# Altium footprint library PcbLib1.PcbLib: 49 footprints (part 1 of 4)
Each footprint in its own frame and in the unit in brackets; x right, y up, seen from the top. Pads: shape width x height; smd on the part's side, far side on the other; paste and mask are expansions set on the pad; w line width, h text height; cw(c..) or ccw(c..) is an arc to the next point about the centre after c.
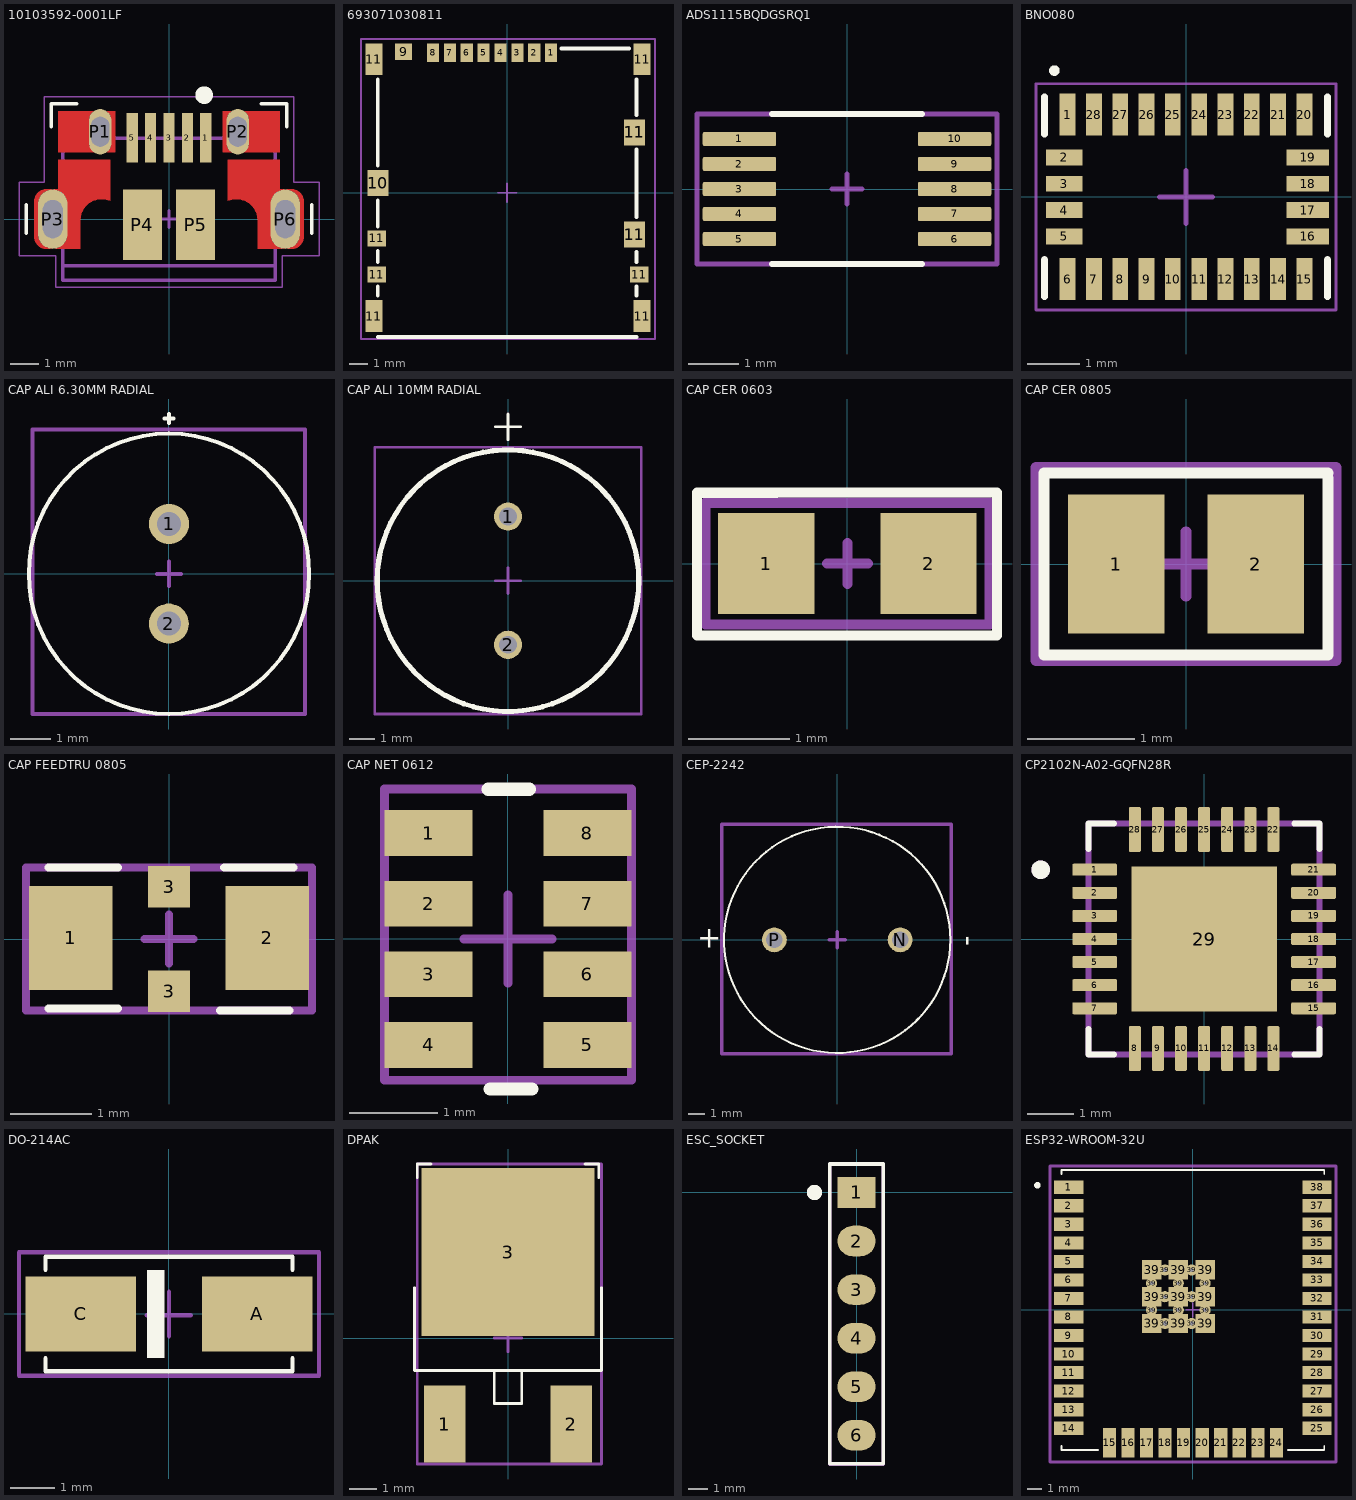
[diagram p0: the footprints below, top view; thin cyan lines are the x and y axes]

## 10103592-0001LF [mm]
pads (11):
  rect 0.4x1.75 smd mask+0.07: 1(1.3,2.875) 2(0.65,2.875) 3(0,2.875) 4(-0.65,2.875) 5(-1.3,2.875)
  oval 0.8x1.6 hole 0.65 slot 1.05 at 90 deg: P1(-2.425,3.08) P2(2.425,3.08)
  oval 1.05x2.1 hole 0.7 slot 1.34 at 90 deg: P3(-4.1,0) P6(4.1,0)
  rect 1.375x2.5 smd mask+0.07: P4(-0.937,-0.2) P5(0.937,-0.2)
Top Layer:
  region: -4.13,1.045 -4.16,1.043 -4.185,1.04 -4.21,1.035 -4.235,1.03 -4.259,1.023 -4.283,1.015 -4.307,1.005 -4.33,0.995 -4.352,0.983 -4.374,0.971 -4.396,0.957 -4.416,0.942 -4.436,0.926 -4.455,0.91 -4.473,0.892 -4.491,0.874 -4.507,0.854 -4.523,0.834 -4.537,0.813 -4.55,0.792 -4.563,0.769 -4.574,0.747 -4.584,0.723 -4.593,0.7 -4.6,0.675 -4.607,0.651 -4.612,0.626 -4.616,0.601 -4.619,0.576 -4.62,0.555 -4.62,-0.525 -4.619,-0.555 -4.617,-0.582 -4.614,-0.608 -4.609,-0.635 -4.602,-0.661 -4.595,-0.687 -4.586,-0.713 -4.575,-0.738 -4.564,-0.762 -4.551,-0.786 -4.537,-0.809 -4.521,-0.832 -4.505,-0.853 -4.487,-0.874 -4.468,-0.893 -4.449,-0.912 -4.428,-0.93 -4.407,-0.946 -4.384,-0.962 -4.361,-0.976 -4.337,-0.989 -4.313,-1 -4.288,-1.011 -4.262,-1.02 -4.236,-1.027 -4.21,-1.034 -4.183,-1.039 -4.157,-1.042 -4.13,-1.044 -4.105,-1.045 -4.105,-1.05 -4.33,-1.05 -4.352,-1.049 -4.374,-1.048 -4.396,-1.045 -4.417,-1.041 -4.439,-1.036 -4.46,-1.029 -4.481,-1.022 -4.501,-1.014 -4.521,-1.004 -4.54,-0.994 -4.559,-0.982 -4.577,-0.97 -4.594,-0.956 -4.611,-0.942 -4.627,-0.927 -4.642,-0.911 -4.656,-0.894 -4.67,-0.877 -4.682,-0.859 -4.694,-0.84 -4.704,-0.821 -4.714,-0.801 -4.722,-0.781 -4.729,-0.76 -4.736,-0.739 -4.741,-0.717 -4.745,-0.696 -4.748,-0.674 -4.749,-0.652 -4.75,-0.63 -4.75,0.63 -4.749,0.652 -4.748,0.674 -4.745,0.696 -4.741,0.717 -4.736,0.739 -4.729,0.76 -4.722,0.781 -4.714,0.801 -4.704,0.821 -4.694,0.84 -4.682,0.859 -4.67,0.877 -4.656,0.894 -4.642,0.911 -4.627,0.927 -4.611,0.942 -4.594,0.956 -4.577,0.97 -4.559,0.982 -4.54,0.994 -4.521,1.004 -4.501,1.014 -4.481,1.022 -4.46,1.029 -4.439,1.036 -4.417,1.041 -4.396,1.045 -4.374,1.048 -4.352,1.049 -4.33,1.05 -4.13,1.05
  region: -2.075,0.64 -2.115,0.656 -2.161,0.671 -2.207,0.684 -2.254,0.693 -2.302,0.699 -2.35,0.703 -2.398,0.703 -2.446,0.7 -2.493,0.694 -2.541,0.685 -2.587,0.673 -2.633,0.658 -2.677,0.64 -2.721,0.619 -2.763,0.596 -2.803,0.57 -2.841,0.541 -2.878,0.51 -2.913,0.477 -2.945,0.442 -2.975,0.404 -3.003,0.365 -3.028,0.324 -3.051,0.281 -3.07,0.238 -3.087,0.193 -3.101,0.147 -3.112,0.1 -3.12,0.053 -3.125,0 -3.125,-1.05 -4.06,-1.05 -4.06,-1.045 -4.03,-1.042 -4.005,-1.038 -3.979,-1.032 -3.954,-1.026 -3.93,-1.018 -3.906,-1.009 -3.882,-0.998 -3.859,-0.987 -3.837,-0.975 -3.815,-0.961 -3.794,-0.946 -3.773,-0.931 -3.754,-0.914 -3.735,-0.896 -3.717,-0.878 -3.7,-0.858 -3.684,-0.838 -3.669,-0.817 -3.655,-0.795 -3.642,-0.773 -3.631,-0.75 -3.62,-0.726 -3.611,-0.702 -3.603,-0.678 -3.596,-0.653 -3.59,-0.628 -3.586,-0.603 -3.583,-0.577 -3.581,-0.551 -3.58,-0.53 -3.585,0.555 -3.586,0.576 -3.589,0.601 -3.593,0.626 -3.598,0.651 -3.605,0.675 -3.612,0.7 -3.621,0.723 -3.631,0.747 -3.642,0.769 -3.655,0.792 -3.668,0.813 -3.682,0.834 -3.698,0.854 -3.714,0.874 -3.732,0.892 -3.75,0.91 -3.769,0.926 -3.789,0.942 -3.809,0.957 -3.831,0.971 -3.853,0.983 -3.875,0.995 -3.898,1.005 -3.922,1.015 -3.946,1.023 -3.97,1.03 -3.995,1.035 -4.02,1.04 -4.045,1.043 -4.075,1.045 -4.075,1.05 -3.9,1.05 -3.9,2.1 -2.075,2.1
  region: 4.352,1.049 4.374,1.048 4.396,1.045 4.417,1.041 4.439,1.036 4.46,1.029 4.481,1.022 4.501,1.014 4.521,1.004 4.54,0.994 4.559,0.982 4.577,0.97 4.594,0.956 4.611,0.942 4.627,0.927 4.642,0.911 4.656,0.894 4.67,0.877 4.682,0.859 4.694,0.84 4.704,0.821 4.714,0.801 4.722,0.781 4.729,0.76 4.736,0.739 4.741,0.717 4.745,0.696 4.748,0.674 4.749,0.652 4.75,0.63 4.75,-0.63 4.749,-0.652 4.748,-0.674 4.745,-0.696 4.741,-0.717 4.736,-0.739 4.729,-0.76 4.722,-0.781 4.714,-0.801 4.704,-0.821 4.694,-0.84 4.682,-0.859 4.67,-0.877 4.656,-0.894 4.642,-0.911 4.627,-0.927 4.611,-0.942 4.594,-0.956 4.577,-0.97 4.559,-0.982 4.54,-0.994 4.521,-1.004 4.501,-1.014 4.481,-1.022 4.46,-1.029 4.439,-1.036 4.417,-1.041 4.396,-1.045 4.374,-1.048 4.352,-1.049 4.33,-1.05 4.105,-1.05 4.105,-1.045 4.13,-1.044 4.157,-1.042 4.183,-1.039 4.21,-1.034 4.236,-1.027 4.262,-1.02 4.288,-1.011 4.313,-1 4.337,-0.989 4.361,-0.976 4.384,-0.962 4.407,-0.946 4.428,-0.93 4.449,-0.912 4.468,-0.893 4.487,-0.874 4.505,-0.853 4.521,-0.832 4.537,-0.809 4.551,-0.786 4.564,-0.762 4.575,-0.738 4.586,-0.713 4.595,-0.687 4.602,-0.661 4.609,-0.635 4.614,-0.608 4.617,-0.582 4.619,-0.555 4.62,-0.525 4.62,0.555 4.619,0.576 4.616,0.601 4.612,0.626 4.607,0.651 4.6,0.675 4.593,0.7 4.584,0.723 4.574,0.747 4.563,0.769 4.55,0.792 4.537,0.813 4.523,0.834 4.507,0.854 4.491,0.874 4.473,0.892 4.455,0.91 4.436,0.926 4.416,0.942 4.396,0.957 4.374,0.971 4.352,0.983 4.33,0.995 4.307,1.005 4.283,1.015 4.259,1.023 4.235,1.03 4.21,1.035 4.185,1.04 4.16,1.043 4.13,1.045 4.13,1.05 4.33,1.05
  region: 3.9,1.05 4.075,1.05 4.075,1.045 4.045,1.043 4.02,1.04 3.995,1.035 3.97,1.03 3.946,1.023 3.922,1.015 3.898,1.005 3.875,0.995 3.853,0.983 3.831,0.971 3.809,0.957 3.789,0.942 3.769,0.926 3.75,0.91 3.732,0.892 3.714,0.874 3.698,0.854 3.682,0.834 3.668,0.813 3.655,0.792 3.642,0.769 3.631,0.747 3.621,0.723 3.612,0.7 3.605,0.675 3.598,0.651 3.593,0.626 3.589,0.601 3.586,0.576 3.585,0.555 3.58,-0.53 3.581,-0.551 3.583,-0.577 3.586,-0.603 3.59,-0.628 3.596,-0.653 3.603,-0.678 3.611,-0.702 3.62,-0.726 3.631,-0.75 3.642,-0.773 3.655,-0.795 3.669,-0.817 3.684,-0.838 3.7,-0.858 3.717,-0.878 3.735,-0.896 3.754,-0.914 3.773,-0.931 3.794,-0.946 3.815,-0.961 3.837,-0.975 3.859,-0.987 3.882,-0.998 3.906,-1.009 3.93,-1.018 3.954,-1.026 3.979,-1.032 4.005,-1.038 4.03,-1.042 4.06,-1.045 4.06,-1.05 3.125,-1.05 3.125,0 3.12,0.053 3.112,0.1 3.101,0.147 3.087,0.193 3.07,0.238 3.051,0.281 3.028,0.324 3.003,0.365 2.975,0.404 2.945,0.442 2.913,0.477 2.878,0.51 2.841,0.541 2.803,0.57 2.763,0.596 2.721,0.619 2.677,0.64 2.633,0.658 2.587,0.673 2.541,0.685 2.493,0.694 2.446,0.7 2.398,0.703 2.35,0.703 2.302,0.699 2.254,0.693 2.207,0.684 2.161,0.671 2.115,0.656 2.075,0.64 2.075,2.1 3.9,2.1
  region: 2.2,3.79 2.191,3.785 2.183,3.78 2.175,3.775 2.168,3.77 2.16,3.765 2.153,3.76 2.146,3.754 2.139,3.748 2.132,3.742 2.126,3.736 2.119,3.729 2.113,3.722 2.107,3.716 2.101,3.709 2.096,3.701 2.09,3.694 2.085,3.687 2.08,3.679 2.076,3.671 2.071,3.663 2.067,3.655 2.063,3.647 2.059,3.639 2.056,3.63 2.052,3.622 2.049,3.613 2.046,3.605 2.044,3.596 2.042,3.587 2.04,3.58 2.03,2.61 2.032,2.597 2.035,2.587 2.037,2.576 2.04,2.566 2.044,2.555 2.047,2.545 2.051,2.535 2.055,2.525 2.06,2.515 2.064,2.505 2.069,2.495 2.075,2.486 2.08,2.477 2.086,2.467 2.092,2.458 2.099,2.45 2.105,2.441 2.112,2.433 2.119,2.424 2.127,2.416 2.134,2.408 2.142,2.401 2.15,2.394 2.158,2.386 2.167,2.38 2.175,2.373 2.184,2.367 2.193,2.36 2.202,2.355 2.21,2.35 1.9,2.35 1.9,3.81 2.2,3.81
  region: 3.9,2.35 2.61,2.35 2.619,2.354 2.628,2.359 2.637,2.364 2.647,2.37 2.656,2.376 2.665,2.382 2.673,2.388 2.682,2.395 2.69,2.401 2.698,2.408 2.706,2.416 2.714,2.423 2.722,2.431 2.729,2.439 2.736,2.447 2.743,2.455 2.749,2.464 2.755,2.472 2.761,2.481 2.767,2.49 2.773,2.5 2.778,2.509 2.783,2.519 2.788,2.528 2.792,2.538 2.796,2.548 2.8,2.558 2.804,2.568 2.807,2.578 2.81,2.59 2.82,3.55 2.819,3.559 2.817,3.57 2.814,3.58 2.812,3.591 2.809,3.601 2.806,3.611 2.802,3.621 2.799,3.631 2.795,3.641 2.79,3.651 2.786,3.661 2.781,3.67 2.776,3.68 2.77,3.689 2.764,3.698 2.758,3.707 2.752,3.715 2.746,3.724 2.739,3.732 2.732,3.74 2.725,3.748 2.718,3.756 2.71,3.764 2.702,3.771 2.694,3.778 2.686,3.785 2.677,3.791 2.669,3.798 2.66,3.804 2.65,3.81 3.9,3.81
  region: -1.9,2.35 -2.21,2.35 -2.202,2.355 -2.193,2.36 -2.184,2.367 -2.175,2.373 -2.167,2.38 -2.158,2.386 -2.15,2.394 -2.142,2.401 -2.134,2.408 -2.127,2.416 -2.119,2.424 -2.112,2.433 -2.105,2.441 -2.099,2.45 -2.092,2.458 -2.086,2.467 -2.08,2.477 -2.075,2.486 -2.069,2.495 -2.064,2.505 -2.06,2.515 -2.055,2.525 -2.051,2.535 -2.047,2.545 -2.044,2.555 -2.04,2.566 -2.037,2.576 -2.035,2.587 -2.032,2.597 -2.03,2.61 -2.04,3.58 -2.042,3.587 -2.044,3.596 -2.046,3.605 -2.049,3.613 -2.052,3.622 -2.056,3.63 -2.059,3.639 -2.063,3.647 -2.067,3.655 -2.071,3.663 -2.076,3.671 -2.08,3.679 -2.085,3.687 -2.09,3.694 -2.096,3.701 -2.101,3.709 -2.107,3.716 -2.113,3.722 -2.119,3.729 -2.126,3.736 -2.132,3.742 -2.139,3.748 -2.146,3.754 -2.153,3.76 -2.16,3.765 -2.168,3.77 -2.175,3.775 -2.183,3.78 -2.191,3.785 -2.2,3.79 -2.2,3.81 -1.9,3.81
  region: -2.66,3.804 -2.669,3.798 -2.677,3.791 -2.686,3.785 -2.694,3.778 -2.702,3.771 -2.71,3.764 -2.718,3.756 -2.725,3.748 -2.732,3.74 -2.739,3.732 -2.746,3.724 -2.752,3.715 -2.758,3.707 -2.764,3.698 -2.77,3.689 -2.776,3.68 -2.781,3.67 -2.786,3.661 -2.79,3.651 -2.795,3.641 -2.799,3.631 -2.802,3.621 -2.806,3.611 -2.809,3.601 -2.812,3.591 -2.814,3.58 -2.817,3.57 -2.819,3.559 -2.82,3.55 -2.81,2.59 -2.807,2.578 -2.804,2.568 -2.8,2.558 -2.796,2.548 -2.792,2.538 -2.788,2.528 -2.783,2.519 -2.778,2.509 -2.773,2.5 -2.767,2.49 -2.761,2.481 -2.755,2.472 -2.749,2.464 -2.743,2.455 -2.736,2.447 -2.729,2.439 -2.722,2.431 -2.714,2.423 -2.706,2.416 -2.698,2.408 -2.69,2.401 -2.682,2.395 -2.673,2.388 -2.665,2.382 -2.656,2.376 -2.647,2.37 -2.637,2.364 -2.628,2.359 -2.619,2.354 -2.61,2.35 -3.9,2.35 -3.9,3.81 -2.65,3.81
Top Overlay:
  circle w0.32: c1.24,4.372 r0.15
  lines w0.127: -5.04,-0.5 -5.04,0.5 ; -4.154,3.25 -4.154,4.064 -3.25,4.064 ; 3.25,4.064 4.154,4.064 4.154,3.25 ; 5.04,-0.5 5.04,0.5
Bottom 3D Body:
  lines w0.05: -5.29,-1.3 -5.29,1.3 -4.404,1.3 -4.404,4.314 4.404,4.314 4.404,1.3 5.29,1.3 5.29,-1.3 4,-1.3 4,-2.4 -4,-2.4 -4,-1.3 -5.29,-1.3
  lines w0.1: -0.3,0 0.3,0 ; 0,-0.3 0,0.3
Bottom Component Center:
  lines w0.127: -3.75,-1.65 3.75,-1.65 ; -3.75,-1.65 -3.75,2.85 3.75,2.85 3.75,-1.65 ; -3.75,-1.65 -3.75,-2.15 3.75,-2.15 3.75,-1.65
  text "'.Designator'" at -3.3,-0.5 h1
3D body "10103592-0001LF--3DModel-STEP-56544.STEP": height 2.78, standoff -0.76, extent -4.25,-2.7 4.25,3.31

## 693071030811 [mm]
pads (19):
  rect 0.65x1 smd: 1(2.35,7.47) 2(1.45,7.47) 3(0.55,7.47) 4(-0.35,7.47) 5(-1.25,7.47) 6(-2.15,7.47) 7(-3.05,7.47) 8(-3.95,7.47)
  rect 0.9x0.9 smd: 9(-5.52,7.52)
  rect 1.13x1.4 smd: 10(-6.89,0.52) 11(6.79,-2.23) 11(6.79,3.22)
  rect 0.9x1.7 smd: 11(-7.1,-6.58) 11(-7.1,7.12) 11(7.2,-6.58) 11(7.2,7.12)
  rect 1x0.85 smd: 11(-6.95,-4.36) 11(-6.95,-2.43) 11(7.05,-4.36)
Top Overlay:
  lines w0.2: -6.9,-7.7 6.9,-7.7 ; -6.9,-5.5 -6.9,-5 ; -6.9,-3.7 -6.9,-3.1 ; -6.9,-1.8 -6.9,-0.4 ; -6.9,1.45 -6.9,6.05 ; 2.9,7.7 6.5,7.7 ; 6.9,-5.5 6.9,-5 ; 6.9,-3.7 6.9,-3.15 ; 6.9,-1.3 6.9,2.3 ; 6.9,4.15 6.9,6.05
Bottom 3D Body:
  lines w0.1: -0.5,0 0,0 ; 0,-0.5 0,0 ; 0,0.5 0,0 ; 0.5,0 0,0 ; -7.8,-7.8 -7.8,8.2 7.9,8.2 7.9,-7.8 -7.8,-7.8
Bottom Component Center:
  lines w0.1: -7.8,-7.8 -7.8,8.2 7.9,8.2 7.9,-7.8 -7.8,-7.8
  text "'.Designator'" at -5.9,-1.9 h2
3D body "693071030811.stp": height 1.3, standoff 0, extent -7.36,-7.65 7.36,7.7

## ADS1115BQDGSRQ1 [mm]
pads (10):
  rrect25% 1.47x0.28 smd mask+0.05: 1(-2.15,1) 2(-2.15,0.5) 3(-2.15,0) 4(-2.15,-0.5) 5(-2.15,-1) 6(2.15,-1) 7(2.15,-0.5) 8(2.15,0) 9(2.15,0.5) 10(2.15,1)
Top Overlay:
  lines w0.127: -1.5,-1.5 1.5,-1.5 ; -1.5,1.5 1.5,1.5
Bottom 3D Body:
  lines w0.1: -0.3,0 0.3,0 ; 0,-0.3 0,0.3 ; -3,-1.5 -3,1.5 3,1.5 3,-1.5 -3,-1.5
Bottom Component Center:
  lines w0.1: -3,-1.5 -3,1.5 3,1.5 3,-1.5 -3,-1.5
  text "'.Designator'" at -2.8,-0.7 h0.7
3D body "step_temp.STEP": height 1.1, standoff 0, extent -2.45,-1.5 2.45,1.5

## BNO080 [mm]
pads (28):
  rect 0.3x0.8 smd mask+0.05: 1(-2.25,1.562) 6(-2.25,-1.562) 7(-1.75,-1.562) 8(-1.25,-1.562) 9(-0.75,-1.562) 10(-0.25,-1.562) 11(0.25,-1.562) 12(0.75,-1.562) 13(1.25,-1.562) 14(1.75,-1.562) 15(2.25,-1.562) 20(2.25,1.562) 21(1.75,1.562) 22(1.25,1.562) 23(0.75,1.562) 24(0.25,1.562) 25(-0.25,1.562) 26(-0.75,1.562) 27(-1.25,1.562) 28(-1.75,1.562)
  rect 0.7x0.3 smd mask+0.05: 2(-2.312,0.75) 3(-2.312,0.25) 4(-2.312,-0.25) 5(-2.312,-0.75)
  rect 0.8x0.3 smd mask+0.05: 16(2.312,-0.75) 17(2.312,-0.25) 18(2.312,0.25) 19(2.312,0.75)
Top Overlay:
  circle w0.1: c-2.5,2.4 r0.05
  lines w0.127: -2.689,-1.9 -2.689,-1.188 ; -2.689,1.188 -2.689,1.9 ; 2.689,-1.9 2.689,-1.188 ; 2.689,1.188 2.689,1.9
Bottom 3D Body:
  lines w0.05: -2.85,-2.15 -2.85,2.15 2.85,2.15 2.85,-2.15 -2.85,-2.15
  lines w0.1: -0.5,0 0,0 ; 0,-0.5 0,0 ; 0,0.5 0,0 ; 0.5,0 0,0
Bottom Component Center:
  lines w0.05: -2.85,-2.15 2.85,-2.15 2.85,2.15 -2.85,2.15 -2.85,-2.15
  text "'.Designator'" at -2.7,-1 h1
3D body "BNO080 v2.STEP": height 1.14, standoff 0.01, extent -2.575,-1.9 2.625,1.9

## CAP ALI 6.30MM RADIAL [mm]
pads (2):
  round 1 hole 0.6 paste+0 mask+0.05: 1(0.002,1.244) 2(-0.002,-1.244)
Top Overlay:
  circle w0.1: c0.002,0 r3.5
  lines w0.1: -0.113,3.875 0.112,3.875 ; 0,3.762 0,3.988
Bottom 3D Body:
  lines w0.1: -0.295,-0.011 0.305,-0.011 ; 0,-0.3 0,0.3 ; -3.4,-3.5 -3.4,3.6 3.4,3.6 3.4,-3.5 -3.4,-3.5
Bottom Component Center:
  lines w0.1: -3.4,-3.5 3.4,-3.5 3.4,3.6 -3.4,3.6 -3.4,-3.5
  text "'.Designator'" at -3,-0.9 h1
3D body "ESH227M016AE3AA.step": height 12.52, standoff -19.99, extent -3.423,-3.406 3.377,3.394

## CAP ALI 10MM RADIAL [mm]
pads (2):
  round 1.1 hole 0.7 paste+0 mask+0.05: 1(0,2.5) 2(0,-2.5)
Top Overlay:
  circle w0.2: c0,0 r5.1
  lines w0.1: -0.5,6 0.5,6 ; 0,5.5 0,6.5
Bottom 3D Body:
  lines w0.1: -5.2,5.1 -5.2,5.2 5.2,5.2 5.2,-5.2 -5.2,-5.2 -5.2,5.15 ; -0.5,0 0.5,0 ; 0,-0.5 0,0.5
Bottom Component Center:
  lines w0.1: -5.2,5.1 -5.2,5.2 5.2,5.2 5.2,-5.2 -5.2,-5.2 -5.2,5.15
  text "'.Designator'" at -4.8,-1.5 h1.5
3D body: height 20, standoff 0, extent -5,-5 5,5
3D body: height 0, standoff -17, extent -0.3,2.2 0.298,2.799
3D body: height 0, standoff -14, extent -0.3,-2.8 0.298,-2.201

## CAP CER 0603 [mm]
pads (2):
  rect 0.95x1 smd paste+0 mask+0.075: 1(-0.8,0) 2(0.8,0)
Top Overlay:
  lines w0.1: -1.484,-0.709 1.475,-0.709 1.475,0.7 0.7,0.7 -0.7,0.7 -0.701,0.699 -1.484,0.699 -1.484,-0.709
Bottom 3D Body:
  lines w0.1: -0.2,0 0.2,0 ; 0,-0.2 0,0.2 ; -1.4,-0.6 1.4,-0.6 1.4,0.6 -1.4,0.6 -1.4,-0.6
Bottom Component Center:
  lines w0.1: -1.4,-0.6 1.4,-0.6 1.4,0.6 -1.4,0.6 -1.4,-0.6
  text "'.Designator'" at -1.27,-0.46 h0.5
3D body "C0603C104K4RAC7411.step": height 0.96, standoff 0.01, extent -0.85,-0.475 0.9,0.475

## CAP CER 0805 [mm]
pads (2):
  rect 0.9x1.3 smd mask+0.075: 1(-0.65,0) 2(0.65,0)
Top Overlay:
  lines w0.1: 1.325,0.8 1.325,-0.85 -1.325,-0.85 -1.325,0.85 -0.762,0.85 0.762,0.85 1.325,0.85
Bottom 3D Body:
  lines w0.1: -0.3,-0.001 0.3,-0.001 ; 0,-0.3 0,0.3 ; 1.35,-0.9 0.65,-0.9 -0.75,-0.9 -1.4,-0.9 -1.4,0.9 1.4,0.9 1.4,-0.9
Bottom Component Center:
  lines w0.1: -1.4,-0.9 1.4,-0.9 1.4,0.9 -1.4,0.9 -1.4,0.284 -1.4,-0.284 -1.4,-0.411 -1.4,-0.665 -1.4,-0.9
  text "'.Designator'" at -1.3,-0.6 h0.6
3D body "CAPC2012X145N EIA 0805.step": height 1.46, standoff 0.01, extent -1,-0.6 1,0.6

## CAP FEEDTRU 0805 [mm]
pads (4):
  rect 1.02x1.27 smd paste+0 mask+0.05: 1(-1.2,0.013) 2(1.2,0.013)
  rect 0.51x0.51 smd paste+0 mask+0.05: 3(0,-0.637) 3(0,0.638)
Top Overlay:
  lines w0.1: -1.475,-0.85 -0.625,-0.85 ; -1.475,0.875 -0.625,0.875 ; 0.625,-0.875 1.475,-0.875 ; 0.675,0.875 1.525,0.875
Top Component Center:
  lines w0.1: -0.3,0 0.3,0 ; 0,-0.3 0,0.3 ; -1.75,-0.875 1.75,-0.875 1.75,0.875 -1.75,0.875 -1.75,-0.875
Top Designator:
  lines w0.1: -1.75,-0.875 1.75,-0.875 1.75,0.875 -1.75,0.875 -1.75,-0.875
  text "'.Designator'" at -1.586,-0.575 h0.6
3D body "LQG15HS27NJ02D.STEP": height 1.15, standoff 0.01, extent -1.005,-0.6 1.005,0.65

## CAP NET 0612 [mm]
pads (8):
  rect 1x0.52 smd paste+0 mask+0.075: 1(-0.9,1.2) 2(-0.9,0.4) 3(-0.9,-0.4) 4(-0.9,-1.2) 5(0.9,-1.2) 6(0.9,-0.4) 7(0.9,0.4) 8(0.9,1.2)
Top Overlay:
  lines w0.152: -0.226,1.695 0.241,1.695 ; -0.2,-1.7 0.268,-1.7
Bottom 3D Body:
  lines w0.1: -0.5,0 0.5,0 ; 0,-0.5 0,0.5 ; -1.4,-1.6 -1.4,1.7 1.4,1.7 1.4,-1.6 -1.4,-1.6
Bottom Component Center:
  lines w0.1: -1.4,-1.6 -1.4,1.7 1.4,1.7 1.4,-1.6 -1.4,-1.6
  text "'.Designator'" at -0.6,1.7 h0.6
3D body "CAP ARRAY 0612.step": height 0.95, standoff 0, extent -0.8,-1.6 0.8,1.6

## CEP-2242 [mm]
pads (2):
  round 1.508 hole 1: N(3.81,0) P(-3.81,0)
Top Overlay:
  circle w0.127: c0,0 r6.85
  text "+" at -8.491,-0.472 h1.27
  text "-" at 8.4,-0.4 h1.27
Bottom 3D Body:
  lines w0.2: -0.5,0 0.5,0 ; 0,-0.5 0,0.5 ; -7,-6.9 6.9,-6.9 6.9,7 -7,7 -7,-6.9
Bottom Component Center:
  lines w0.2: -7,-6.9 6.9,-6.9 6.9,7 -7,7 -7,-6.9
  text "'.Designator'" at -4.9,1.3 h1.5
3D body "cep-2242.stp": height 7.61, standoff -6.19, extent -6.85,-6.85 6.85,6.85

## CP2102N-A02-GQFN28R [mm]
pads (29):
  rrect25% 0.97x0.26 smd mask+0.05: 1(-2.37,1.5) 2(-2.37,1) 3(-2.37,0.5) 4(-2.37,0) 5(-2.37,-0.5) 6(-2.37,-1) 7(-2.37,-1.5) 15(2.37,-1.5) 16(2.37,-1) 17(2.37,-0.5) 18(2.37,0) 19(2.37,0.5) 20(2.37,1) 21(2.37,1.5)
  rrect25% 0.26x0.97 smd mask+0.05: 8(-1.5,-2.37) 9(-1,-2.37) 10(-0.5,-2.37) 11(0,-2.37) 12(0.5,-2.37) 13(1,-2.37) 14(1.5,-2.37) 22(1.5,2.37) 23(1,2.37) 24(0.5,2.37) 25(0,2.37) 26(-0.5,2.37) 27(-1,2.37) 28(-1.5,2.37)
  rect 3.15x3.15 smd mask+0.05: 29(0,0)
Top Overlay:
  circle w0.2: c-3.54,1.5 r0.1
  lines w0.127: -2.5,-1.95 -2.5,-2.5 -1.95,-2.5 ; -2.5,1.95 -2.5,2.5 -1.95,2.5 ; 1.95,-2.5 2.5,-2.5 2.5,-1.95 ; 1.95,2.5 2.5,2.5 2.5,1.95
Bottom 3D Body:
  circle w0.2: c-3.54,1.5 r0.1
  lines w0.1: -0.5,0 0.5,0 ; 0,-0.5 0,0.5
  lines w0.127: -2.5,-2.5 2.5,-2.5 2.5,2.5 -2.5,2.5 -2.5,-2.5
Bottom Component Center:
  lines w0.127: -2.5,-2.5 2.5,-2.5 2.5,2.5 -2.5,2.5 -2.5,-2.5
  text "'.Designator'" at -2.3,-0.7 h0.8
3D body: height 0.75, standoff 0, extent -2.5,-2.5 2.5,2.5
3D body: height 0.76, standoff 0.75, extent -1.998,1.6 -1.6,2

## DO-214AC [mm]
pads (2):
  rect 2.5x1.7 smd paste+0 mask+0.075: A(2,0) C(-2,0)
Top Overlay:
  rectangle: -0.5,-1 -0.1,1
  lines w0.1: -2.8,-1 -2.8,-1.3 2.8,-1.3 2.8,-1 ; -2.8,1 -2.8,1.3 2.8,1.3 2.8,1
Bottom 3D Body:
  lines w0.1: -0.504,-0.027 0.496,-0.027 ; 0,-0.5 0,0.5 ; -3.4,-1.4 -3.4,1.4 3.4,1.4 3.4,-1.4 -3.4,-1.4
Bottom Component Center:
  lines w0.1: -3.4,-1.4 -3.4,1.4 3.4,1.4 3.4,-1.4 -3.4,-1.4
  text "'.Designator'" at -3,-0.7 h0.8
3D body "DO2214AC.step": height 2.6, standoff 0.03, extent -2.75,-1.4 2.75,1.4

## DPAK [mm]
pads (3):
  rect 1.5x2.8 smd paste+0 mask+0.075: 1(-2.3,-3.125) 2(2.3,-3.125)
  rect 6.3x6.1 smd paste+0 mask+0.075: 3(0,3.125)
Top Overlay:
  lines w0.1: -3.4,1.825 -3.4,-1.175 3.4,-1.175 3.4,1.825 ; -3.3,5.825 -3.3,6.325 -2.8,6.325 ; -0.5,-1.175 -0.5,-2.375 0.5,-2.375 0.5,-1.175 ; 2.8,6.325 3.3,6.325 3.3,5.825
Bottom 3D Body:
  lines w0.1: -0.5,0 0.5,0 ; 0,-0.5 0,0.5 ; -3.3,-4.575 -3.3,6.325 3.4,6.325 3.4,-4.575 -3.3,-4.575
Bottom Component Center:
  lines w0.1: -3.3,-4.575 3.4,-4.575 3.4,6.325 -3.3,6.325 -3.3,-4.575
  text "'.Designator'" at -2.8,0.1 h0.8
3D body "DPAK_TO-252AA.step": height 2.41, standoff 0.01, extent -3.367,-4.125 3.367,5.975

## ESC_SOCKET [mm]
pads (6):
  rect 2x1.6 smd: 1(0,0)
  oval 2x1.6 smd: 2(0,-2.54) 3(0,-5.08) 4(0,-7.62) 5(0,-10.16) 6(0,-12.7)
Top Overlay:
  circle w0.4: c-2.2,0 r0.2
  lines w0.2: -1.4,-14.19 -1.4,1.49 1.4,1.49 1.4,-14.19 -1.4,-14.19
Bottom 3D Body:
  lines w0.1: -0.5,0 0.5,0 ; 0,-0.5 0,0.5
  lines w0.2: -1.403,-14.205 1.397,-14.205 1.397,1.475 -1.403,1.475 -1.403,-14.205
Bottom Component Center:
  lines w0.2: -1.4,-14.19 1.4,-14.19 1.4,1.49 -1.4,1.49 -1.4,-14.19
  text "'.Designator'" at -0.9,0.7 h1

## ESP32-WROOM-32U [mm]
pads (59):
  rect 2x0.9 smd mask+0.075: 1(-8.5,8.41) 2(-8.5,7.14) 3(-8.5,5.87) 4(-8.5,4.6) 5(-8.5,3.33) 6(-8.5,2.06) 7(-8.5,0.79) 8(-8.5,-0.48) 9(-8.5,-1.75) 10(-8.5,-3.02) 11(-8.5,-4.29) 12(-8.5,-5.56) 13(-8.5,-6.83) 14(-8.5,-8.1) 25(8.5,-8.1) 26(8.5,-6.83) 27(8.5,-5.56) 28(8.5,-4.29) 29(8.5,-3.02) 30(8.5,-1.75) 31(8.5,-0.48) 32(8.5,0.79) 33(8.5,2.06) 34(8.5,3.33) 35(8.5,4.6) 36(8.5,5.87) 37(8.5,7.14) 38(8.5,8.41)
  rect 0.9x2 smd mask+0.075: 15(-5.715,-9.1) 16(-4.445,-9.1) 17(-3.175,-9.1) 18(-1.905,-9.1) 19(-0.635,-9.1) 20(0.635,-9.1) 21(1.905,-9.1) 22(3.175,-9.1) 23(4.445,-9.1) 24(5.715,-9.1)
  rect 1.33x1.33 smd mask+0.075: 39(-2.835,-0.925) 39(-2.835,0.91) 39(-2.835,2.745) 39(-1,-0.925) 39(-1,0.91) 39(-1,2.745) 39(0.835,-0.925) 39(0.835,0.91) 39(0.835,2.745)
  round 0.762 hole 0.254: 39(-2.835,-0.008) 39(-2.835,1.827) 39(-1.917,-0.925) 39(-1.917,0.91) 39(-1.917,2.745) 39(-1,-0.008) 39(-1,1.827) 39(-0.082,-0.925) 39(-0.082,0.91) 39(-0.082,2.745) 39(0.835,-0.008) 39(0.835,1.827)
Top Overlay:
  circle w0.25: c-10.65,8.54 r0.1
  lines w0.127: -9,-9.3 -9,-9.6 -6.49,-9.6 ; -9,9.3 -9,9.6 9,9.6 9,9.3 ; 6.49,-9.6 9,-9.6 9,-9.3
Bottom 3D Body:
  lines w0.1: -0.5,0 0.5,0 ; 0,-0.5 0,0.5 ; -9.8,-10.4 -9.8,9.85 9.8,9.85 9.8,-10.4 -9.8,-10.4
Bottom Component Center:
  lines w0.2: -9.8,-10.4 -9.8,9.85 9.8,9.85 9.8,-10.4 -9.8,-10.4
  text "'.Designator'" at -9.1,-2.8 h3
3D body "ESP32-WROOM-32U--3DModel-STEP-56544.STEP": height 3.31, standoff 0.01, extent -9,-9.6 9,9.6